# Altium footprint library Herry.PcbLib: 76 footprints (part 4 of 5)
Each footprint in its own frame and in the unit in brackets; x right, y up, seen from the top. Pads: shape width x height; smd on the part's side, far side on the other; paste and mask are expansions set on the pad; w line width, h text height; cw(c..) or ccw(c..) is an arc to the next point about the centre after c.
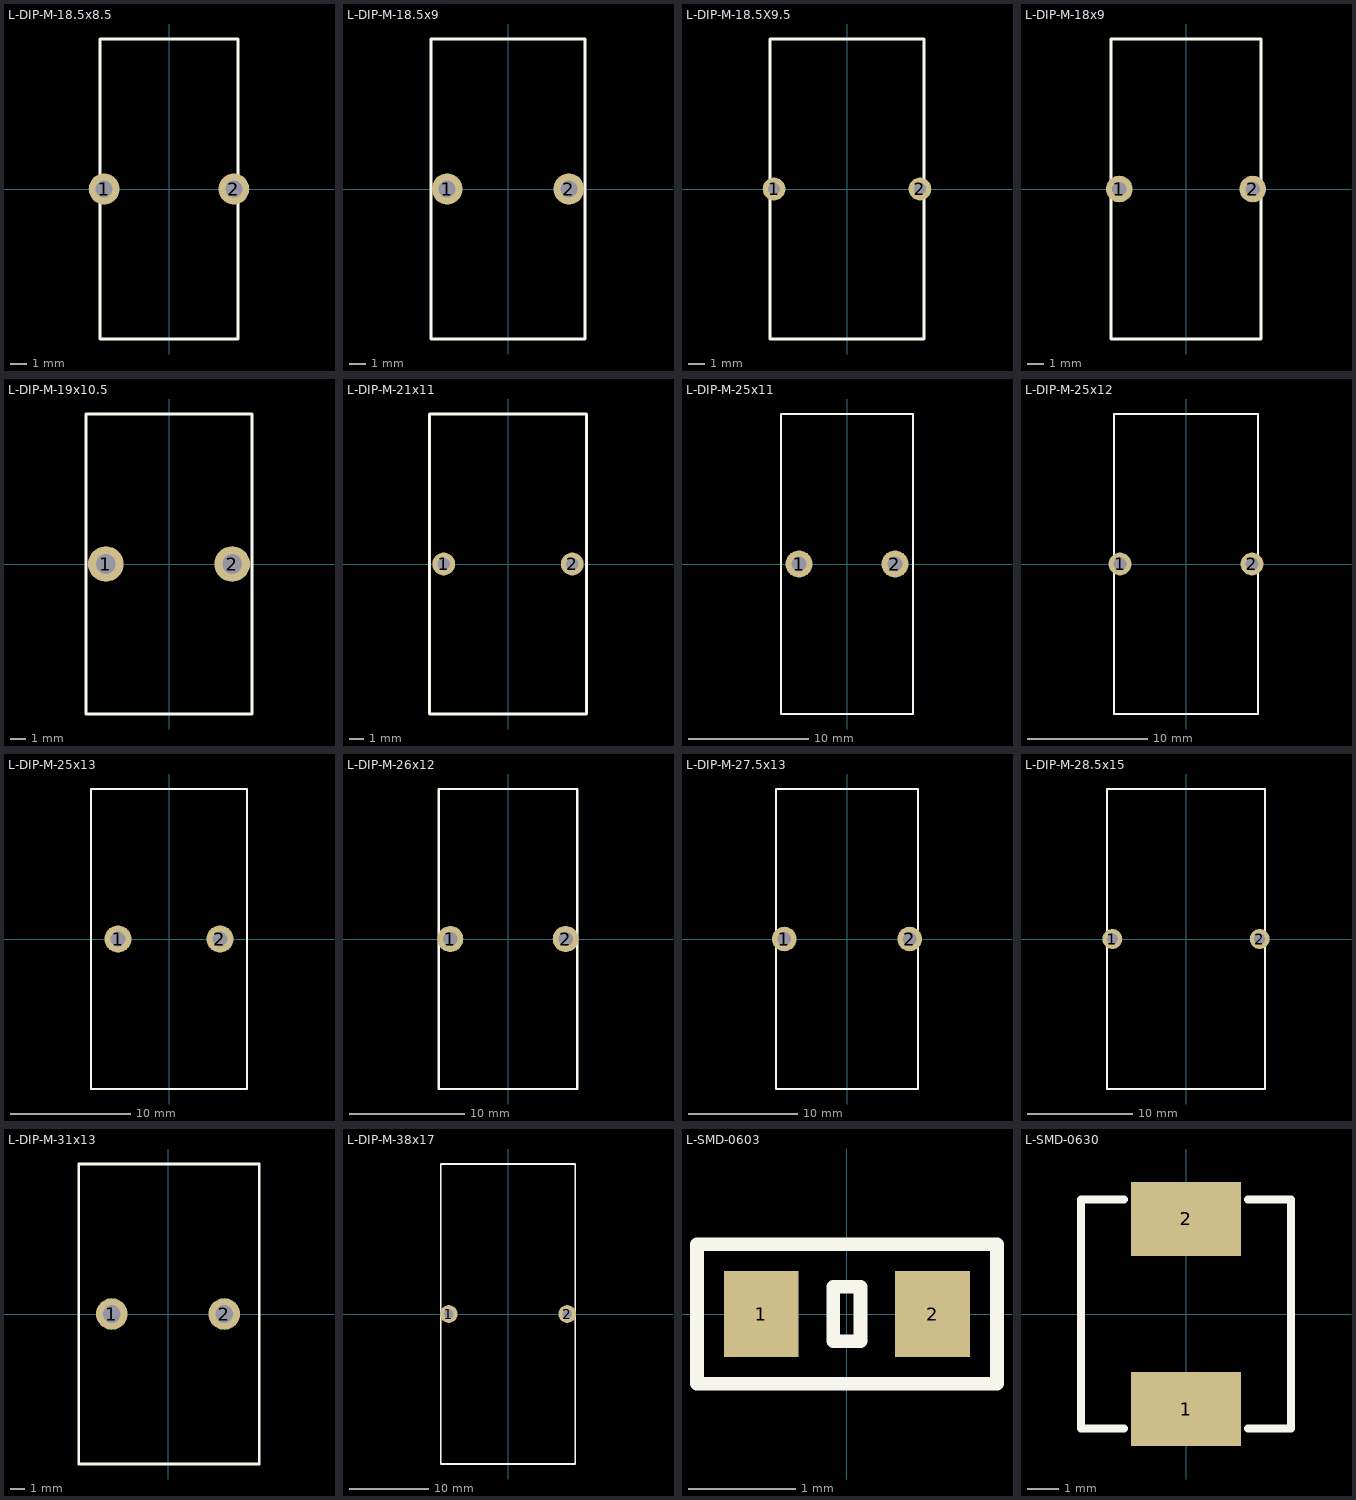
[diagram p3: the footprints below, top view; thin cyan lines are the x and y axes]

## L-DIP-M-18.5x8.5 [mm] "Body 18.5x8.5mm, 2 leads"
height 18.5
pads (2):
  round 1.9 hole 1.05: 1(-4,0) 2(4,0)
Top Overlay:
  lines w0.2: -4.25,-9.25 -4.25,9.25 4.25,9.25 4.25,-9.25 -4.25,-9.25
3D body "7447015.stp": height 20.02, standoff -14.25, extent -5.07,-10.059 5.07,10.058

## L-DIP-M-18.5x9 [mm] "Body 18.5x9.5mm, 2 leads"
height 18.5
pads (2):
  round 1.9 hole 1.05: 1(-3.75,0) 2(3.75,0)
Top Overlay:
  lines w0.2: -4.75,-9.25 4.75,-9.25 4.75,9.25 -4.75,9.25 -4.75,-9.25
3D body "7447013.stp": height 20.02, standoff -14.25, extent -5.57,-10.059 5.57,10.058

## L-DIP-M-18.5X9.5 [mm] "Body 18.5x9.5mm, 2 leads"
height 18.5
pads (2):
  round 1.4 hole 0.75: 1(-4.5,0) 2(4.5,0)
Top Overlay:
  lines w0.2: -4.75,-9.25 4.75,-9.25 4.75,9.25 -4.75,9.25 -4.75,-9.25
3D body "7447010.stp": height 19.9, standoff -14.25, extent -5.42,-9.915 5.42,9.916

## L-DIP-M-18x9 [mm] "Body 18x9mm, 2 leads"
height 18
pads (2):
  round 1.6 hole 0.85: 1(-4,0) 2(4,0)
Top Overlay:
  lines w0.2: -4.5,-9 -4.5,9 4.5,9 4.5,-9 -4.5,-9
3D body "7447012.stp": height 19.6, standoff -14, extent -5.12,-9.614 5.12,9.614

## L-DIP-M-19x10.5 [mm] "Body 19x10.5mm, 2 leads"
height 19
pads (2):
  round 2.25 hole 1.25: 1(-4,0) 2(4,0)
Top Overlay:
  lines w0.2: -5.25,-9.5 -5.25,9.5 5.25,9.5 5.25,-9.5 -5.25,-9.5
3D body "7447016.stp": height 17.32, standoff -14.3, extent -4.27,-8.693 4.27,8.694

## L-DIP-M-21x11 [mm] "Body 21x11mm, 2 leads"
height 21
pads (2):
  round 1.6 hole 0.85: 1(-4.5,0) 2(4.5,0)
Top Overlay:
  lines w0.2: -5.5,-10.5 -5.5,10.5 5.5,10.5 5.5,-10.5 -5.5,-10.5
3D body "7447060.stp": height 23.1, standoff -23.5, extent -6.12,-11.114 6.12,11.115

## L-DIP-M-25x11 [mm] "Body 25x11mm, 2 leads"
height 25
pads (2):
  round 2.25 hole 1.25: 1(-4,0) 2(4,0)
Top Overlay:
  lines w0.2: -5.5,-12.5 5.5,-12.5 5.5,12.5 -5.5,12.5 -5.5,-12.5
3D body "7447070.stp": height 27.48, standoff -13.5, extent -6.52,-13.508 6.52,13.509

## L-DIP-M-25x12 [mm] "Body 25x12mm, 2 leads"
height 25
pads (2):
  round 1.9 hole 1.05: 1(-5.5,0) 2(5.5,0)
Top Overlay:
  lines w0.2: -6,-12.5 -6,12.5 6,12.5 6,-12.5 -6,-12.5
3D body "7447071.stp": height 27.3, standoff -23.5, extent -6.82,-13.312 6.82,13.312

## L-DIP-M-25x13 [mm] "Body 25x13mm, 2 leads"
height 25
pads (2):
  round 2.25 hole 1.25: 1(-4.25,0) 2(4.25,0)
Top Overlay:
  lines w0.2: -6.5,-12.5 -6.5,12.5 6.5,12.5 6.5,-12.5 -6.5,-12.5
3D body "Download_STP_7447055.stp": height 25.48, standoff -14.5, extent -4.75,-12.494 4.75,12.493

## L-DIP-M-26x12 [mm] "Body 26x12mm, 2 leads"
height 26
pads (2):
  round 2.25 hole 1.25: 1(-5,0) 2(5,0)
Top Overlay:
  lines w0.2: -6,-13 -6,13 6,13 6,-13 -6,-13
3D body "7447065.stp": height 25.48, standoff -14.5, extent -4.75,-12.494 4.75,12.493

## L-DIP-M-27.5x13 [mm] "Body 27.5x13mm, 2 leads"
height 27.5
pads (2):
  round 2.25 hole 1.25: 1(-5.75,0) 2(5.75,0)
Top Overlay:
  lines w0.2: -6.5,-13.75 6.5,-13.75 6.5,13.75 -6.5,13.75 -6.5,-13.75
3D body "7447076.stp": height 28.22, standoff -11.95, extent -6.5,-13.741 6.5,13.744

## L-DIP-M-28.5x15 [mm] "Body 28.5x15mm, 2 leads"
height 28.5
pads (2):
  round 1.9 hole 1.05: 1(-7,0) 2(7,0)
Top Overlay:
  lines w0.2: -7.5,-14.25 7.5,-14.25 7.5,14.25 -7.5,14.25 -7.5,-14.25
3D body "7447075.stp": height 30.65, standoff -23.75, extent -8.42,-15.164 8.42,15.163

## L-DIP-M-31x13 [mm]
height 19
pads (2):
  round 2.25 hole 1.25: 1(-4,0) 2(4,0)
Top Overlay:
  lines w0.2: -6.35,-10.668 6.477,-10.668 6.477,10.668 -6.35,10.668 -6.35,-10.668
3D body "7447017.stp": height 20.93, standoff -14, extent -6.27,-10.493 6.27,10.497

## L-DIP-M-38x17 [mm] "Body 38x17mm, 2 leads"
height 38
pads (2):
  round 2.25 hole 1.25: 1(-7.5,0) 2(7.5,0)
Top Overlay:
  lines w0.2: -8.5,-19 -8.5,19 8.5,19 8.5,-19 -8.5,-19
3D body "7447019.stp": height 40.49, standoff -13.5, extent -9.52,-20.01 9.52,20.01

## L-SMD-0603 [mm]
pads (2):
  rect 0.7x0.8 smd: 1(-0.8,0) 2(0.8,0)
Top Overlay:
  lines w0.127: -1.4,-0.65 1.401,-0.65 1.401,0.651 -1.4,0.651 -1.4,-0.65 ; -0.127,-0.254 -0.127,0.254 0.127,0.254 0.127,-0.254 -0.127,-0.254
3D body "L_0603.stp": height 0.81, standoff 0.01, extent -0.8,-0.4 0.8,0.4

## L-SMD-0630 [mm] "6.6x6.6"
pads (2):
  rect 3.5x2.35 smd: 1(0,-3.025) 2(0,3.025)
Top Overlay:
  lines w0.254: -1.981,-3.65 -3.35,-3.65 -3.35,3.65 -1.981,3.65 ; 1.981,-3.65 3.35,-3.65 3.35,3.65 1.981,3.65
3D body "Inductor_SMD_AMPLF_0630.STEP": height 2.81, standoff -0.2, extent -3.35,-3.65 3.35,3.65